# Altium integrated library GPDSE.IntLib: 634 symbols (part 3 of 7)
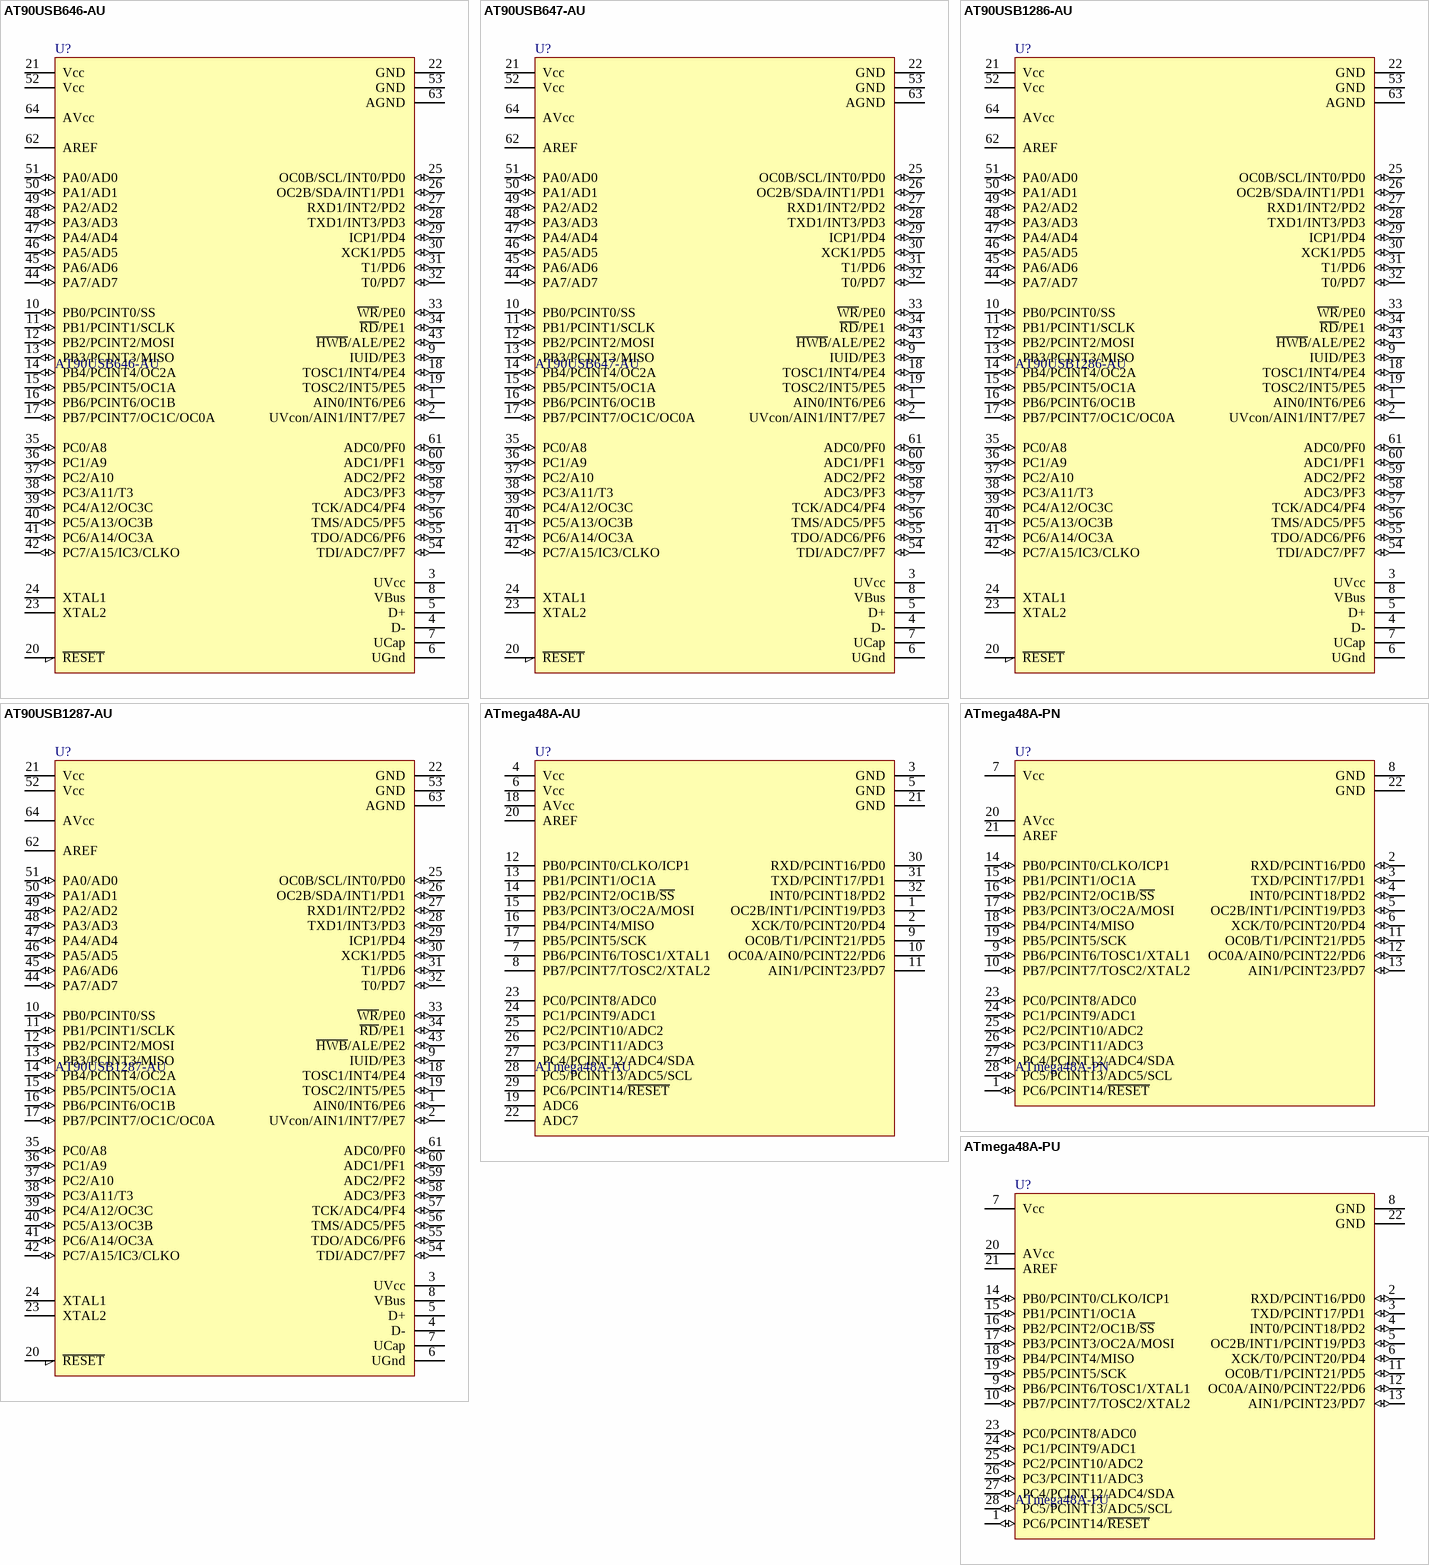
[diagram p37: symbols AT90USB646-AU to ATmega48A-PU]

## AT90USB1286-AU
designator U?
8-bit Microcontroller with 124 KB of ISP Flash and USB Controller; ADC Channel: 8; Analog Comparator: 1; Clock Frequency: 0 - 16 MHz; EEPROM Memory: 4 KB; Flash Memory: 128 KB; I/O Pins: 48; PWM Channel: 10; SRAM Memory: 8 KB; Supply Voltage (Vdd): 2.7 - 5.5 V; Timer 8 bits: 2; Debug: JTAG; USB Function: Device; Serial I2C: 1; Serial SPI: 1; Serial USART: 1; Timer 16 bits: 2; USB Controller: 1
footprint QFP64-14.0mm(0.8mm)
pins: 1 AIN0/INT6/PE6 (io), 2 UVcon/AIN1/INT7/PE7 (io), 3 UVcc, 4 D-, 5 D+, 6 UGnd, 7 UCap, 8 VBus, 9 IUID/PE3 (io), 10 PB0/PCINT0/SS (io), 11 PB1/PCINT1/SCLK (io), 12 PB2/PCINT2/MOSI (io), 13 PB3/PCINT3/MISO (io), 14 PB4/PCINT4/OC2A (io), 15 PB5/PCINT5/OC1A (io), 16 PB6/PCINT6/OC1B (io), 17 PB7/PCINT7/OC1C/OC0A (io), 18 TOSC1/INT4/PE4 (io), 19 TOSC2/INT5/PE5 (io), 20 ~{RESET}, 21 Vcc, 22 GND, 23 XTAL2, 24 XTAL1, 25 OC0B/SCL/INT0/PD0 (io), 26 OC2B/SDA/INT1/PD1 (io), 27 RXD1/INT2/PD2 (io), 28 TXD1/INT3/PD3 (io), 29 ICP1/PD4 (io), 30 XCK1/PD5 (io), 31 T1/PD6 (io), 32 T0/PD7 (io), 33 ~{WR}/PE0 (io), 34 ~{RD}/PE1 (io), 35 PC0/A8 (io), 36 PC1/A9 (io), 37 PC2/A10 (io), 38 PC3/A11/T3 (io), 39 PC4/A12/OC3C (io), 40 PC5/A13/OC3B (io), 41 PC6/A14/OC3A (io), 42 PC7/A15/IC3/CLKO (io), 43 ~{HWB}/ALE/PE2 (io), 44 PA7/AD7 (io), 45 PA6/AD6 (io), 46 PA5/AD5 (io), 47 PA4/AD4 (io), 48 PA3/AD3 (io), 49 PA2/AD2 (io), 50 PA1/AD1 (io), 51 PA0/AD0 (io), 52 Vcc, 53 GND, 54 TDI/ADC7/PF7 (io), 55 TDO/ADC6/PF6 (io), 56 TMS/ADC5/PF5 (io), 57 TCK/ADC4/PF4 (io), 58 ADC3/PF3 (io), 59 ADC2/PF2 (io), 60 ADC1/PF1 (io), 61 ADC0/PF0 (io), 62 AREF, 63 AGND, 64 AVcc

## AT90USB1287-AU
designator U?
8-bit Microcontroller with 128 KB of ISP Flash and USB Controller; ADC Channel: 8; Analog Comparator: 1; Clock Frequency: 0 - 16 MHz; EEPROM Memory: 4 KB; Flash Memory: 128 KB; I/O Pins: 48; PWM Channel: 10; SRAM Memory: 8 KB; Supply Voltage (Vdd): 2.7 - 5.5 V; Timer 8 bits: 2; Debug: JTAG; USB Function: OTG; Serial I2C: 1; Serial SPI: 1; Serial USART: 1; Timer 16 bits: 2; USB Controller: 1
footprint QFP64-14.0mm(0.8mm)
pins: 1 AIN0/INT6/PE6 (io), 2 UVcon/AIN1/INT7/PE7 (io), 3 UVcc, 4 D-, 5 D+, 6 UGnd, 7 UCap, 8 VBus, 9 IUID/PE3 (io), 10 PB0/PCINT0/SS (io), 11 PB1/PCINT1/SCLK (io), 12 PB2/PCINT2/MOSI (io), 13 PB3/PCINT3/MISO (io), 14 PB4/PCINT4/OC2A (io), 15 PB5/PCINT5/OC1A (io), 16 PB6/PCINT6/OC1B (io), 17 PB7/PCINT7/OC1C/OC0A (io), 18 TOSC1/INT4/PE4 (io), 19 TOSC2/INT5/PE5 (io), 20 ~{RESET}, 21 Vcc, 22 GND, 23 XTAL2, 24 XTAL1, 25 OC0B/SCL/INT0/PD0 (io), 26 OC2B/SDA/INT1/PD1 (io), 27 RXD1/INT2/PD2 (io), 28 TXD1/INT3/PD3 (io), 29 ICP1/PD4 (io), 30 XCK1/PD5 (io), 31 T1/PD6 (io), 32 T0/PD7 (io), 33 ~{WR}/PE0 (io), 34 ~{RD}/PE1 (io), 35 PC0/A8 (io), 36 PC1/A9 (io), 37 PC2/A10 (io), 38 PC3/A11/T3 (io), 39 PC4/A12/OC3C (io), 40 PC5/A13/OC3B (io), 41 PC6/A14/OC3A (io), 42 PC7/A15/IC3/CLKO (io), 43 ~{HWB}/ALE/PE2 (io), 44 PA7/AD7 (io), 45 PA6/AD6 (io), 46 PA5/AD5 (io), 47 PA4/AD4 (io), 48 PA3/AD3 (io), 49 PA2/AD2 (io), 50 PA1/AD1 (io), 51 PA0/AD0 (io), 52 Vcc, 53 GND, 54 TDI/ADC7/PF7 (io), 55 TDO/ADC6/PF6 (io), 56 TMS/ADC5/PF5 (io), 57 TCK/ADC4/PF4 (io), 58 ADC3/PF3 (io), 59 ADC2/PF2 (io), 60 ADC1/PF1 (io), 61 ADC0/PF0 (io), 62 AREF, 63 AGND, 64 AVcc

## ATmega48A-AU
designator U?
8-bit AVR Microcontroller with 4 KB In-System Programmable Flash; Flash Memory: 4 KB; EEPROM Memory: 256 B; SRAM Memory: 512 B; Timer 8 bits: 2; Timer 16 bits: 1; PWM Channel: 6; ADC Channel: 8; I/O Pins: 23; Supply Voltage (Vdd): 1.8 - 5.5 V; Clock Frequency: 0 - 20 MHz; Debug: debugWire; Serial USART: 1; Serial SPI: 1; Serial I2C: 1; Analog Comparator: 1
footprint QFP32-7.0mm(0.8mm)
pins: 1 OC2B/INT1/PCINT19/PD3, 2 XCK/T0/PCINT20/PD4, 3 GND, 4 Vcc, 5 GND, 6 Vcc, 7 PB6/PCINT6/TOSC1/XTAL1, 8 PB7/PCINT7/TOSC2/XTAL2, 9 OC0B/T1/PCINT21/PD5, 10 OC0A/AIN0/PCINT22/PD6, 11 AIN1/PCINT23/PD7, 12 PB0/PCINT0/CLKO/ICP1, 13 PB1/PCINT1/OC1A, 14 PB2/PCINT2/OC1B/~{SS}, 15 PB3/PCINT3/OC2A/MOSI, 16 PB4/PCINT4/MISO, 17 PB5/PCINT5/SCK, 18 AVcc, 19 ADC6, 20 AREF, 21 GND, 22 ADC7, 23 PC0/PCINT8/ADC0, 24 PC1/PCINT9/ADC1, 25 PC2/PCINT10/ADC2, 26 PC3/PCINT11/ADC3, 27 PC4/PCINT12/ADC4/SDA, 28 PC5/PCINT13/ADC5/SCL, 29 PC6/PCINT14/~{RESET}, 30 RXD/PCINT16/PD0, 31 TXD/PCINT17/PD1, 32 INT0/PCINT18/PD2

## ATmega48A-PN
designator U?
8-bit AVR Microcontroller with 4 KB In-System Programmable Flash; Flash Memory: 4 KB; EEPROM Memory: 256 B; SRAM Memory: 512 B; Timer 8 bits: 2; Timer 16 bits: 1; PWM Channel: 6; I/O Pins: 23; Supply Voltage (Vdd): 1.8 - 5.5 V; Clock Frequency: 0 - 20 MHz; Debug: debugWire; ADC Channel: 6; Serial USART: 1; Serial SPI: 1; Serial I2C: 1; Analog Comparator: 1
footprint DIP28-300(100) (DIP, 28-Leads, Row Spacing 7.62mm, Pitch 2.54mm, Body 34.67x7.3mm)
pins: 1 PC6/PCINT14/~{RESET} (io), 2 RXD/PCINT16/PD0 (io), 3 TXD/PCINT17/PD1 (io), 4 INT0/PCINT18/PD2 (io), 5 OC2B/INT1/PCINT19/PD3 (io), 6 XCK/T0/PCINT20/PD4 (io), 7 Vcc, 8 GND, 9 PB6/PCINT6/TOSC1/XTAL1 (io), 10 PB7/PCINT7/TOSC2/XTAL2 (io), 11 OC0B/T1/PCINT21/PD5 (io), 12 OC0A/AIN0/PCINT22/PD6 (io), 13 AIN1/PCINT23/PD7 (io), 14 PB0/PCINT0/CLKO/ICP1 (io), 15 PB1/PCINT1/OC1A (io), 16 PB2/PCINT2/OC1B/~{SS} (io), 17 PB3/PCINT3/OC2A/MOSI (io), 18 PB4/PCINT4/MISO (io), 19 PB5/PCINT5/SCK (io), 20 AVcc, 21 AREF, 22 GND, 23 PC0/PCINT8/ADC0 (io), 24 PC1/PCINT9/ADC1 (io), 25 PC2/PCINT10/ADC2 (io), 26 PC3/PCINT11/ADC3 (io), 27 PC4/PCINT12/ADC4/SDA (io), 28 PC5/PCINT13/ADC5/SCL (io)

## ATmega48A-PU
designator U?
8-bit AVR Microcontroller with 4 KB In-System Programmable Flash; Flash Memory: 4 KB; EEPROM Memory: 256 B; SRAM Memory: 512 B; Timer 8 bits: 2; Timer 16 bits: 1; PWM Channel: 6; I/O Pins: 23; Supply Voltage (Vdd): 1.8 - 5.5 V; Clock Frequency: 0 - 20 MHz; Debug: debugWire; ADC Channel: 6; Serial USART: 1; Serial SPI: 1; Serial I2C: 1; Analog Comparator: 1
footprint DIP28-300(100) (DIP, 28-Leads, Row Spacing 7.62mm, Pitch 2.54mm, Body 34.67x7.3mm)
pins: 1 PC6/PCINT14/~{RESET} (io), 2 RXD/PCINT16/PD0 (io), 3 TXD/PCINT17/PD1 (io), 4 INT0/PCINT18/PD2 (io), 5 OC2B/INT1/PCINT19/PD3 (io), 6 XCK/T0/PCINT20/PD4 (io), 7 Vcc, 8 GND, 9 PB6/PCINT6/TOSC1/XTAL1 (io), 10 PB7/PCINT7/TOSC2/XTAL2 (io), 11 OC0B/T1/PCINT21/PD5 (io), 12 OC0A/AIN0/PCINT22/PD6 (io), 13 AIN1/PCINT23/PD7 (io), 14 PB0/PCINT0/CLKO/ICP1 (io), 15 PB1/PCINT1/OC1A (io), 16 PB2/PCINT2/OC1B/~{SS} (io), 17 PB3/PCINT3/OC2A/MOSI (io), 18 PB4/PCINT4/MISO (io), 19 PB5/PCINT5/SCK (io), 20 AVcc, 21 AREF, 22 GND, 23 PC0/PCINT8/ADC0 (io), 24 PC1/PCINT9/ADC1 (io), 25 PC2/PCINT10/ADC2 (io), 26 PC3/PCINT11/ADC3 (io), 27 PC4/PCINT12/ADC4/SDA (io), 28 PC5/PCINT13/ADC5/SCL (io)

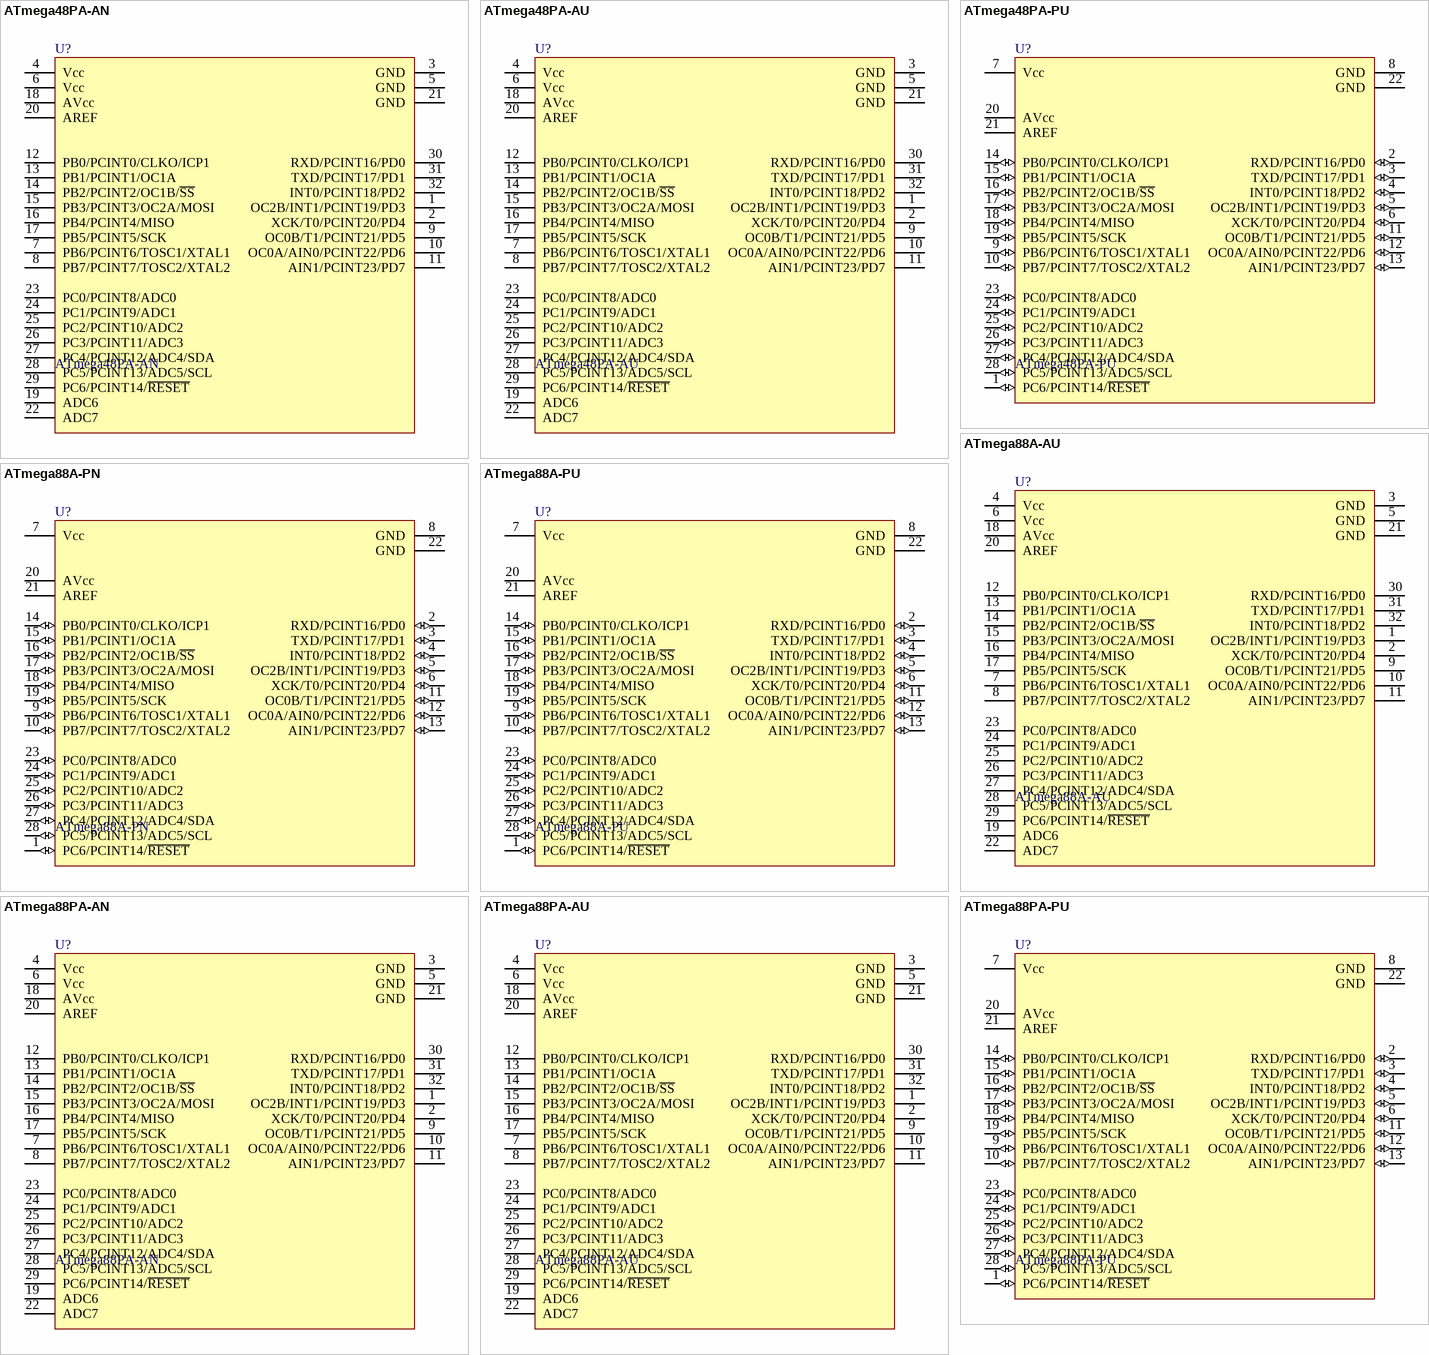
[diagram p13: symbols ATmega48PA-AN to ATmega88PA-PU]

## ATmega48PA-AN
designator U?
8-bit AVR Microcontroller with 4 KB In-System Programmable Flash; Flash Memory: 4 KB; EEPROM Memory: 256 B; SRAM Memory: 512 B; Timer 8 bits: 2; Timer 16 bits: 1; PWM Channel: 6; ADC Channel: 8; I/O Pins: 23; Supply Voltage (Vdd): 1.8 - 5.5 V; Clock Frequency: 0 - 20 MHz; Debug: debugWire; Serial USART: 1; Serial SPI: 1; Serial I2C: 1; Analog Comparator: 1
footprint QFP32-7.0mm(0.8mm)
pins: 1 OC2B/INT1/PCINT19/PD3, 2 XCK/T0/PCINT20/PD4, 3 GND, 4 Vcc, 5 GND, 6 Vcc, 7 PB6/PCINT6/TOSC1/XTAL1, 8 PB7/PCINT7/TOSC2/XTAL2, 9 OC0B/T1/PCINT21/PD5, 10 OC0A/AIN0/PCINT22/PD6, 11 AIN1/PCINT23/PD7, 12 PB0/PCINT0/CLKO/ICP1, 13 PB1/PCINT1/OC1A, 14 PB2/PCINT2/OC1B/~{SS}, 15 PB3/PCINT3/OC2A/MOSI, 16 PB4/PCINT4/MISO, 17 PB5/PCINT5/SCK, 18 AVcc, 19 ADC6, 20 AREF, 21 GND, 22 ADC7, 23 PC0/PCINT8/ADC0, 24 PC1/PCINT9/ADC1, 25 PC2/PCINT10/ADC2, 26 PC3/PCINT11/ADC3, 27 PC4/PCINT12/ADC4/SDA, 28 PC5/PCINT13/ADC5/SCL, 29 PC6/PCINT14/~{RESET}, 30 RXD/PCINT16/PD0, 31 TXD/PCINT17/PD1, 32 INT0/PCINT18/PD2

## ATmega48PA-AU
designator U?
8-bit AVR Microcontroller with 4 KB In-System Programmable Flash; Flash Memory: 4 KB; EEPROM Memory: 256 B; SRAM Memory: 512 B; Timer 8 bits: 2; Timer 16 bits: 1; PWM Channel: 6; ADC Channel: 8; I/O Pins: 23; Supply Voltage (Vdd): 1.8 - 5.5 V; Clock Frequency: 0 - 20 MHz; Debug: debugWire; Serial USART: 1; Serial SPI: 1; Serial I2C: 1; Analog Comparator: 1
footprint QFP32-7.0mm(0.8mm)
pins: 1 OC2B/INT1/PCINT19/PD3, 2 XCK/T0/PCINT20/PD4, 3 GND, 4 Vcc, 5 GND, 6 Vcc, 7 PB6/PCINT6/TOSC1/XTAL1, 8 PB7/PCINT7/TOSC2/XTAL2, 9 OC0B/T1/PCINT21/PD5, 10 OC0A/AIN0/PCINT22/PD6, 11 AIN1/PCINT23/PD7, 12 PB0/PCINT0/CLKO/ICP1, 13 PB1/PCINT1/OC1A, 14 PB2/PCINT2/OC1B/~{SS}, 15 PB3/PCINT3/OC2A/MOSI, 16 PB4/PCINT4/MISO, 17 PB5/PCINT5/SCK, 18 AVcc, 19 ADC6, 20 AREF, 21 GND, 22 ADC7, 23 PC0/PCINT8/ADC0, 24 PC1/PCINT9/ADC1, 25 PC2/PCINT10/ADC2, 26 PC3/PCINT11/ADC3, 27 PC4/PCINT12/ADC4/SDA, 28 PC5/PCINT13/ADC5/SCL, 29 PC6/PCINT14/~{RESET}, 30 RXD/PCINT16/PD0, 31 TXD/PCINT17/PD1, 32 INT0/PCINT18/PD2

## ATmega48PA-PU
designator U?
8-bit AVR Microcontroller with 4 KB In-System Programmable Flash; Flash Memory: 4 KB; EEPROM Memory: 256 B; SRAM Memory: 512 B; Timer 8 bits: 2; Timer 16 bits: 1; PWM Channel: 6; I/O Pins: 23; Supply Voltage (Vdd): 1.8 - 5.5 V; Clock Frequency: 0 - 20 MHz; Debug: debugWire; ADC Channel: 6; Serial USART: 1; Serial SPI: 1; Serial I2C: 1; Analog Comparator: 1
footprint DIP28-300(100) (DIP, 28-Leads, Row Spacing 7.62mm, Pitch 2.54mm, Body 34.67x7.3mm)
pins: 1 PC6/PCINT14/~{RESET} (io), 2 RXD/PCINT16/PD0 (io), 3 TXD/PCINT17/PD1 (io), 4 INT0/PCINT18/PD2 (io), 5 OC2B/INT1/PCINT19/PD3 (io), 6 XCK/T0/PCINT20/PD4 (io), 7 Vcc, 8 GND, 9 PB6/PCINT6/TOSC1/XTAL1 (io), 10 PB7/PCINT7/TOSC2/XTAL2 (io), 11 OC0B/T1/PCINT21/PD5 (io), 12 OC0A/AIN0/PCINT22/PD6 (io), 13 AIN1/PCINT23/PD7 (io), 14 PB0/PCINT0/CLKO/ICP1 (io), 15 PB1/PCINT1/OC1A (io), 16 PB2/PCINT2/OC1B/~{SS} (io), 17 PB3/PCINT3/OC2A/MOSI (io), 18 PB4/PCINT4/MISO (io), 19 PB5/PCINT5/SCK (io), 20 AVcc, 21 AREF, 22 GND, 23 PC0/PCINT8/ADC0 (io), 24 PC1/PCINT9/ADC1 (io), 25 PC2/PCINT10/ADC2 (io), 26 PC3/PCINT11/ADC3 (io), 27 PC4/PCINT12/ADC4/SDA (io), 28 PC5/PCINT13/ADC5/SCL (io)

## ATmega88A-AU
designator U?
8-bit AVR Microcontroller with 8 KB In-System Programmable Flash; Flash Memory: 8 KB; EEPROM Memory: 512 B; SRAM Memory: 1 KB; Timer 8 bits: 2; Timer 16 bits: 1; PWM Channel: 6; ADC Channel: 8; I/O Pins: 23; Supply Voltage (Vdd): 1.8 - 5.5 V; Clock Frequency: 0 - 20 MHz; Debug: debugWire; Serial USART: 1; Serial SPI: 1; Serial I2C: 1; Analog Comparator: 1
footprint QFP32-7.0mm(0.8mm)
pins: 1 OC2B/INT1/PCINT19/PD3, 2 XCK/T0/PCINT20/PD4, 3 GND, 4 Vcc, 5 GND, 6 Vcc, 7 PB6/PCINT6/TOSC1/XTAL1, 8 PB7/PCINT7/TOSC2/XTAL2, 9 OC0B/T1/PCINT21/PD5, 10 OC0A/AIN0/PCINT22/PD6, 11 AIN1/PCINT23/PD7, 12 PB0/PCINT0/CLKO/ICP1, 13 PB1/PCINT1/OC1A, 14 PB2/PCINT2/OC1B/~{SS}, 15 PB3/PCINT3/OC2A/MOSI, 16 PB4/PCINT4/MISO, 17 PB5/PCINT5/SCK, 18 AVcc, 19 ADC6, 20 AREF, 21 GND, 22 ADC7, 23 PC0/PCINT8/ADC0, 24 PC1/PCINT9/ADC1, 25 PC2/PCINT10/ADC2, 26 PC3/PCINT11/ADC3, 27 PC4/PCINT12/ADC4/SDA, 28 PC5/PCINT13/ADC5/SCL, 29 PC6/PCINT14/~{RESET}, 30 RXD/PCINT16/PD0, 31 TXD/PCINT17/PD1, 32 INT0/PCINT18/PD2

## ATmega88A-PN
designator U?
8-bit AVR Microcontroller with 8 KB In-System Programmable Flash; Flash Memory: 8 KB; EEPROM Memory: 512 B; SRAM Memory: 1 KB; Timer 8 bits: 2; Timer 16 bits: 1; PWM Channel: 6; I/O Pins: 23; Supply Voltage (Vdd): 1.8 - 5.5 V; Clock Frequency: 0 - 20 MHz; Debug: debugWire; ADC Channel: 6; Serial USART: 1; Serial SPI: 1; Serial I2C: 1; Analog Comparator: 1
footprint DIP28-300(100) (DIP, 28-Leads, Row Spacing 7.62mm, Pitch 2.54mm, Body 34.67x7.3mm)
pins: 1 PC6/PCINT14/~{RESET} (io), 2 RXD/PCINT16/PD0 (io), 3 TXD/PCINT17/PD1 (io), 4 INT0/PCINT18/PD2 (io), 5 OC2B/INT1/PCINT19/PD3 (io), 6 XCK/T0/PCINT20/PD4 (io), 7 Vcc, 8 GND, 9 PB6/PCINT6/TOSC1/XTAL1 (io), 10 PB7/PCINT7/TOSC2/XTAL2 (io), 11 OC0B/T1/PCINT21/PD5 (io), 12 OC0A/AIN0/PCINT22/PD6 (io), 13 AIN1/PCINT23/PD7 (io), 14 PB0/PCINT0/CLKO/ICP1 (io), 15 PB1/PCINT1/OC1A (io), 16 PB2/PCINT2/OC1B/~{SS} (io), 17 PB3/PCINT3/OC2A/MOSI (io), 18 PB4/PCINT4/MISO (io), 19 PB5/PCINT5/SCK (io), 20 AVcc, 21 AREF, 22 GND, 23 PC0/PCINT8/ADC0 (io), 24 PC1/PCINT9/ADC1 (io), 25 PC2/PCINT10/ADC2 (io), 26 PC3/PCINT11/ADC3 (io), 27 PC4/PCINT12/ADC4/SDA (io), 28 PC5/PCINT13/ADC5/SCL (io)

## ATmega88A-PU
designator U?
8-bit AVR Microcontroller with 8 KB In-System Programmable Flash; Flash Memory: 8 KB; EEPROM Memory: 512 B; SRAM Memory: 1 KB; Timer 8 bits: 2; Timer 16 bits: 1; PWM Channel: 6; I/O Pins: 23; Supply Voltage (Vdd): 1.8 - 5.5 V; Clock Frequency: 0 - 20 MHz; Debug: debugWire; ADC Channel: 6; Serial USART: 1; Serial SPI: 1; Serial I2C: 1; Analog Comparator: 1
footprint DIP28-300(100) (DIP, 28-Leads, Row Spacing 7.62mm, Pitch 2.54mm, Body 34.67x7.3mm)
pins: 1 PC6/PCINT14/~{RESET} (io), 2 RXD/PCINT16/PD0 (io), 3 TXD/PCINT17/PD1 (io), 4 INT0/PCINT18/PD2 (io), 5 OC2B/INT1/PCINT19/PD3 (io), 6 XCK/T0/PCINT20/PD4 (io), 7 Vcc, 8 GND, 9 PB6/PCINT6/TOSC1/XTAL1 (io), 10 PB7/PCINT7/TOSC2/XTAL2 (io), 11 OC0B/T1/PCINT21/PD5 (io), 12 OC0A/AIN0/PCINT22/PD6 (io), 13 AIN1/PCINT23/PD7 (io), 14 PB0/PCINT0/CLKO/ICP1 (io), 15 PB1/PCINT1/OC1A (io), 16 PB2/PCINT2/OC1B/~{SS} (io), 17 PB3/PCINT3/OC2A/MOSI (io), 18 PB4/PCINT4/MISO (io), 19 PB5/PCINT5/SCK (io), 20 AVcc, 21 AREF, 22 GND, 23 PC0/PCINT8/ADC0 (io), 24 PC1/PCINT9/ADC1 (io), 25 PC2/PCINT10/ADC2 (io), 26 PC3/PCINT11/ADC3 (io), 27 PC4/PCINT12/ADC4/SDA (io), 28 PC5/PCINT13/ADC5/SCL (io)

## ATmega88PA-AN
designator U?
8-bit AVR Microcontroller with 8 KB In-System Programmable Flash; Flash Memory: 8 KB; EEPROM Memory: 512 B; SRAM Memory: 1 KB; Timer 8 bits: 2; Timer 16 bits: 1; PWM Channel: 6; ADC Channel: 8; I/O Pins: 23; Supply Voltage (Vdd): 1.8 - 5.5 V; Clock Frequency: 0 - 20 MHz; Debug: debugWire; Serial USART: 1; Serial SPI: 1; Serial I2C: 1; Analog Comparator: 1
footprint QFP32-7.0mm(0.8mm)
pins: 1 OC2B/INT1/PCINT19/PD3, 2 XCK/T0/PCINT20/PD4, 3 GND, 4 Vcc, 5 GND, 6 Vcc, 7 PB6/PCINT6/TOSC1/XTAL1, 8 PB7/PCINT7/TOSC2/XTAL2, 9 OC0B/T1/PCINT21/PD5, 10 OC0A/AIN0/PCINT22/PD6, 11 AIN1/PCINT23/PD7, 12 PB0/PCINT0/CLKO/ICP1, 13 PB1/PCINT1/OC1A, 14 PB2/PCINT2/OC1B/~{SS}, 15 PB3/PCINT3/OC2A/MOSI, 16 PB4/PCINT4/MISO, 17 PB5/PCINT5/SCK, 18 AVcc, 19 ADC6, 20 AREF, 21 GND, 22 ADC7, 23 PC0/PCINT8/ADC0, 24 PC1/PCINT9/ADC1, 25 PC2/PCINT10/ADC2, 26 PC3/PCINT11/ADC3, 27 PC4/PCINT12/ADC4/SDA, 28 PC5/PCINT13/ADC5/SCL, 29 PC6/PCINT14/~{RESET}, 30 RXD/PCINT16/PD0, 31 TXD/PCINT17/PD1, 32 INT0/PCINT18/PD2

## ATmega88PA-AU
designator U?
8-bit AVR Microcontroller with 8 KB In-System Programmable Flash; Flash Memory: 8 KB; EEPROM Memory: 512 B; SRAM Memory: 1 KB; Timer 8 bits: 2; Timer 16 bits: 1; PWM Channel: 6; ADC Channel: 8; I/O Pins: 23; Supply Voltage (Vdd): 1.8 - 5.5 V; Clock Frequency: 0 - 20 MHz; Debug: debugWire; Serial USART: 1; Serial SPI: 1; Serial I2C: 1; Analog Comparator: 1
footprint QFP32-7.0mm(0.8mm)
pins: 1 OC2B/INT1/PCINT19/PD3, 2 XCK/T0/PCINT20/PD4, 3 GND, 4 Vcc, 5 GND, 6 Vcc, 7 PB6/PCINT6/TOSC1/XTAL1, 8 PB7/PCINT7/TOSC2/XTAL2, 9 OC0B/T1/PCINT21/PD5, 10 OC0A/AIN0/PCINT22/PD6, 11 AIN1/PCINT23/PD7, 12 PB0/PCINT0/CLKO/ICP1, 13 PB1/PCINT1/OC1A, 14 PB2/PCINT2/OC1B/~{SS}, 15 PB3/PCINT3/OC2A/MOSI, 16 PB4/PCINT4/MISO, 17 PB5/PCINT5/SCK, 18 AVcc, 19 ADC6, 20 AREF, 21 GND, 22 ADC7, 23 PC0/PCINT8/ADC0, 24 PC1/PCINT9/ADC1, 25 PC2/PCINT10/ADC2, 26 PC3/PCINT11/ADC3, 27 PC4/PCINT12/ADC4/SDA, 28 PC5/PCINT13/ADC5/SCL, 29 PC6/PCINT14/~{RESET}, 30 RXD/PCINT16/PD0, 31 TXD/PCINT17/PD1, 32 INT0/PCINT18/PD2

## ATmega88PA-PU
designator U?
8-bit AVR Microcontroller with 8 KB In-System Programmable Flash; Flash Memory: 8 KB; EEPROM Memory: 512 B; SRAM Memory: 1 KB; Timer 8 bits: 2; Timer 16 bits: 1; PWM Channel: 6; I/O Pins: 23; Supply Voltage (Vdd): 1.8 - 5.5 V; Clock Frequency: 0 - 20 MHz; Debug: debugWire; ADC Channel: 6; Serial USART: 1; Serial SPI: 1; Serial I2C: 1; Analog Comparator: 1
footprint DIP28-300(100) (DIP, 28-Leads, Row Spacing 7.62mm, Pitch 2.54mm, Body 34.67x7.3mm)
pins: 1 PC6/PCINT14/~{RESET} (io), 2 RXD/PCINT16/PD0 (io), 3 TXD/PCINT17/PD1 (io), 4 INT0/PCINT18/PD2 (io), 5 OC2B/INT1/PCINT19/PD3 (io), 6 XCK/T0/PCINT20/PD4 (io), 7 Vcc, 8 GND, 9 PB6/PCINT6/TOSC1/XTAL1 (io), 10 PB7/PCINT7/TOSC2/XTAL2 (io), 11 OC0B/T1/PCINT21/PD5 (io), 12 OC0A/AIN0/PCINT22/PD6 (io), 13 AIN1/PCINT23/PD7 (io), 14 PB0/PCINT0/CLKO/ICP1 (io), 15 PB1/PCINT1/OC1A (io), 16 PB2/PCINT2/OC1B/~{SS} (io), 17 PB3/PCINT3/OC2A/MOSI (io), 18 PB4/PCINT4/MISO (io), 19 PB5/PCINT5/SCK (io), 20 AVcc, 21 AREF, 22 GND, 23 PC0/PCINT8/ADC0 (io), 24 PC1/PCINT9/ADC1 (io), 25 PC2/PCINT10/ADC2 (io), 26 PC3/PCINT11/ADC3 (io), 27 PC4/PCINT12/ADC4/SDA (io), 28 PC5/PCINT13/ADC5/SCL (io)

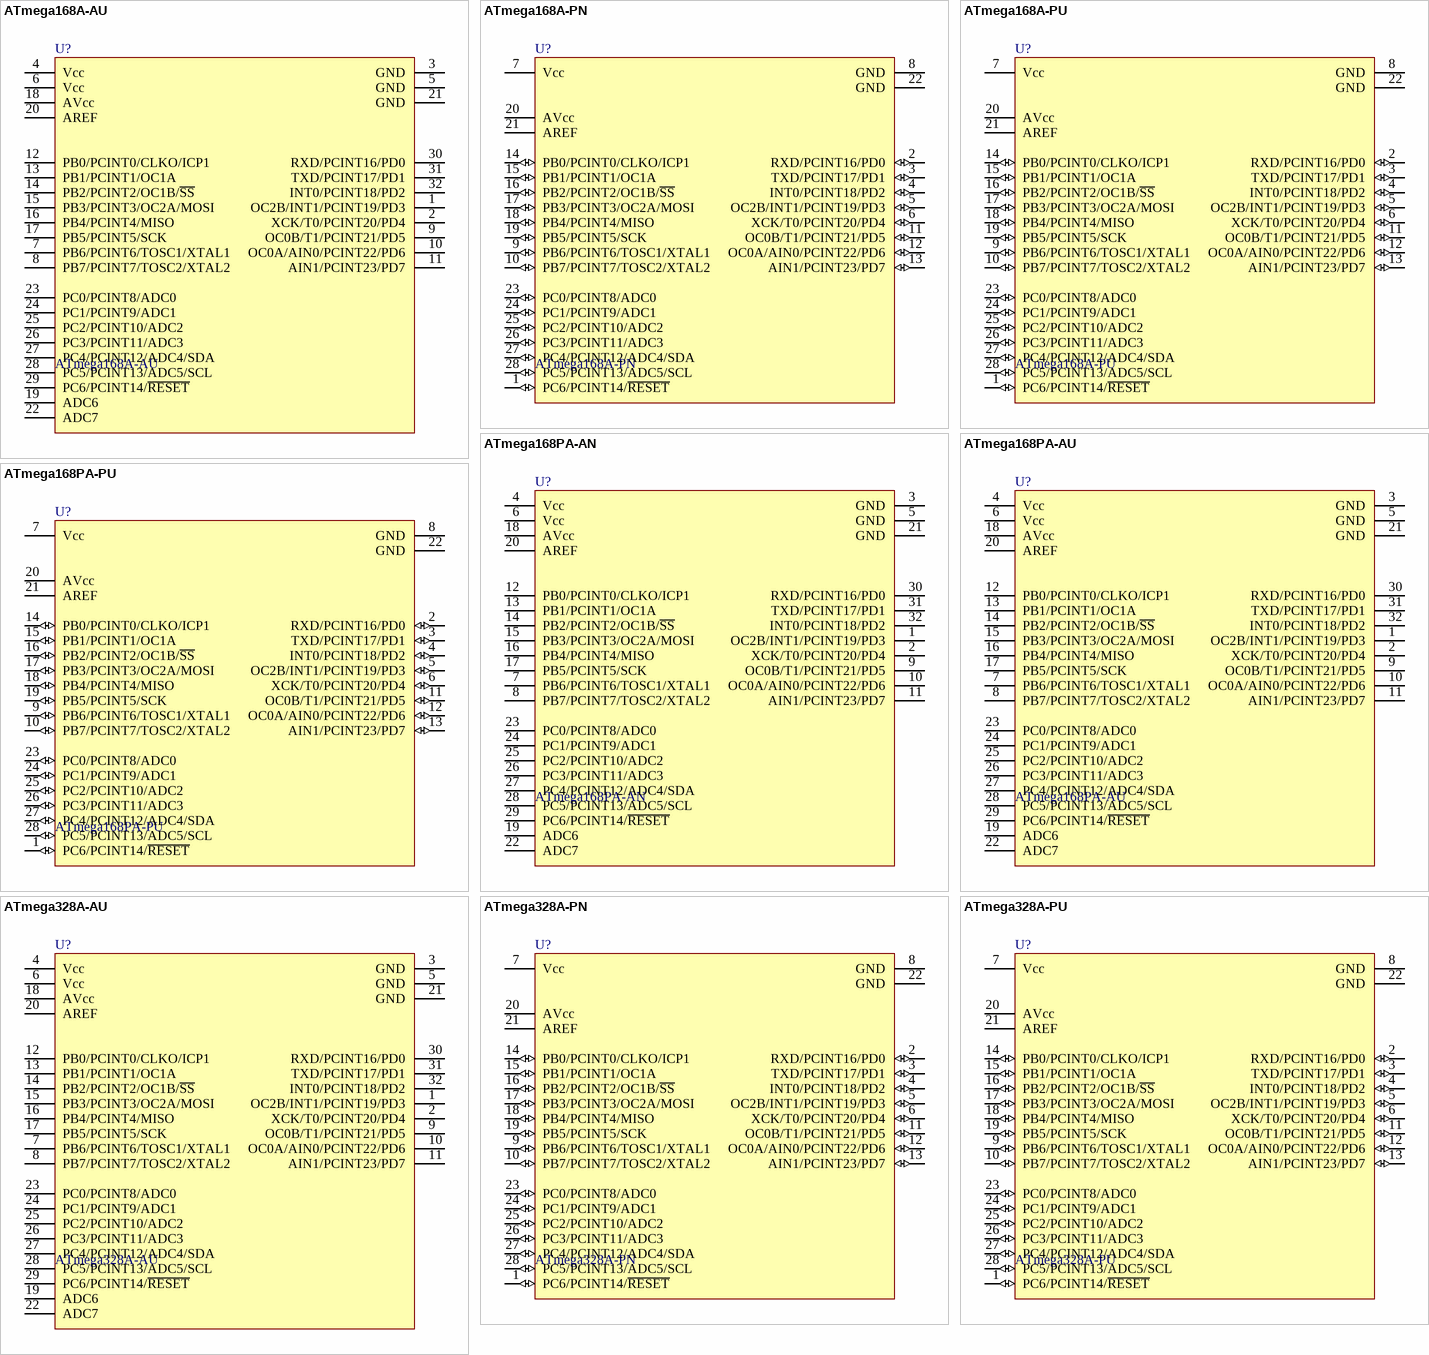
[diagram p14: symbols ATmega168A-AU to ATmega328A-PU]

## ATmega168A-AU
designator U?
8-bit AVR Microcontroller with 16 KB In-System Programmable Flash; Flash Memory: 16 KB; EEPROM Memory: 512 B; SRAM Memory: 1 KB; Timer 8 bits: 2; Timer 16 bits: 1; PWM Channel: 6; ADC Channel: 8; I/O Pins: 23; Supply Voltage (Vdd): 1.8 - 5.5 V; Clock Frequency: 0 - 20 MHz; Debug: debugWire; Serial USART: 1; Serial SPI: 1; Serial I2C: 1; Analog Comparator: 1
footprint QFP32-7.0mm(0.8mm)
pins: 1 OC2B/INT1/PCINT19/PD3, 2 XCK/T0/PCINT20/PD4, 3 GND, 4 Vcc, 5 GND, 6 Vcc, 7 PB6/PCINT6/TOSC1/XTAL1, 8 PB7/PCINT7/TOSC2/XTAL2, 9 OC0B/T1/PCINT21/PD5, 10 OC0A/AIN0/PCINT22/PD6, 11 AIN1/PCINT23/PD7, 12 PB0/PCINT0/CLKO/ICP1, 13 PB1/PCINT1/OC1A, 14 PB2/PCINT2/OC1B/~{SS}, 15 PB3/PCINT3/OC2A/MOSI, 16 PB4/PCINT4/MISO, 17 PB5/PCINT5/SCK, 18 AVcc, 19 ADC6, 20 AREF, 21 GND, 22 ADC7, 23 PC0/PCINT8/ADC0, 24 PC1/PCINT9/ADC1, 25 PC2/PCINT10/ADC2, 26 PC3/PCINT11/ADC3, 27 PC4/PCINT12/ADC4/SDA, 28 PC5/PCINT13/ADC5/SCL, 29 PC6/PCINT14/~{RESET}, 30 RXD/PCINT16/PD0, 31 TXD/PCINT17/PD1, 32 INT0/PCINT18/PD2

## ATmega168A-PN
designator U?
8-bit AVR Microcontroller with 16 KB In-System Programmable Flash; Flash Memory: 16 KB; EEPROM Memory: 512 B; SRAM Memory: 1 KB; Timer 8 bits: 2; Timer 16 bits: 1; PWM Channel: 6; I/O Pins: 23; Supply Voltage (Vdd): 1.8 - 5.5 V; Clock Frequency: 0 - 20 MHz; Debug: debugWire; ADC Channel: 6; Serial USART: 1; Serial SPI: 1; Serial I2C: 1; Analog Comparator: 1
footprint DIP28-300(100) (DIP, 28-Leads, Row Spacing 7.62mm, Pitch 2.54mm, Body 34.67x7.3mm)
pins: 1 PC6/PCINT14/~{RESET} (io), 2 RXD/PCINT16/PD0 (io), 3 TXD/PCINT17/PD1 (io), 4 INT0/PCINT18/PD2 (io), 5 OC2B/INT1/PCINT19/PD3 (io), 6 XCK/T0/PCINT20/PD4 (io), 7 Vcc, 8 GND, 9 PB6/PCINT6/TOSC1/XTAL1 (io), 10 PB7/PCINT7/TOSC2/XTAL2 (io), 11 OC0B/T1/PCINT21/PD5 (io), 12 OC0A/AIN0/PCINT22/PD6 (io), 13 AIN1/PCINT23/PD7 (io), 14 PB0/PCINT0/CLKO/ICP1 (io), 15 PB1/PCINT1/OC1A (io), 16 PB2/PCINT2/OC1B/~{SS} (io), 17 PB3/PCINT3/OC2A/MOSI (io), 18 PB4/PCINT4/MISO (io), 19 PB5/PCINT5/SCK (io), 20 AVcc, 21 AREF, 22 GND, 23 PC0/PCINT8/ADC0 (io), 24 PC1/PCINT9/ADC1 (io), 25 PC2/PCINT10/ADC2 (io), 26 PC3/PCINT11/ADC3 (io), 27 PC4/PCINT12/ADC4/SDA (io), 28 PC5/PCINT13/ADC5/SCL (io)

## ATmega168A-PU
designator U?
8-bit AVR Microcontroller with 16 KB In-System Programmable Flash; Flash Memory: 16 KB; EEPROM Memory: 512 B; SRAM Memory: 1 KB; Timer 8 bits: 2; Timer 16 bits: 1; PWM Channel: 6; I/O Pins: 23; Supply Voltage (Vdd): 1.8 - 5.5 V; Clock Frequency: 0 - 20 MHz; Debug: debugWire; ADC Channel: 6; Serial USART: 1; Serial SPI: 1; Serial I2C: 1; Analog Comparator: 1
footprint DIP28-300(100) (DIP, 28-Leads, Row Spacing 7.62mm, Pitch 2.54mm, Body 34.67x7.3mm)
pins: 1 PC6/PCINT14/~{RESET} (io), 2 RXD/PCINT16/PD0 (io), 3 TXD/PCINT17/PD1 (io), 4 INT0/PCINT18/PD2 (io), 5 OC2B/INT1/PCINT19/PD3 (io), 6 XCK/T0/PCINT20/PD4 (io), 7 Vcc, 8 GND, 9 PB6/PCINT6/TOSC1/XTAL1 (io), 10 PB7/PCINT7/TOSC2/XTAL2 (io), 11 OC0B/T1/PCINT21/PD5 (io), 12 OC0A/AIN0/PCINT22/PD6 (io), 13 AIN1/PCINT23/PD7 (io), 14 PB0/PCINT0/CLKO/ICP1 (io), 15 PB1/PCINT1/OC1A (io), 16 PB2/PCINT2/OC1B/~{SS} (io), 17 PB3/PCINT3/OC2A/MOSI (io), 18 PB4/PCINT4/MISO (io), 19 PB5/PCINT5/SCK (io), 20 AVcc, 21 AREF, 22 GND, 23 PC0/PCINT8/ADC0 (io), 24 PC1/PCINT9/ADC1 (io), 25 PC2/PCINT10/ADC2 (io), 26 PC3/PCINT11/ADC3 (io), 27 PC4/PCINT12/ADC4/SDA (io), 28 PC5/PCINT13/ADC5/SCL (io)

## ATmega168PA-AN
designator U?
8-bit AVR Microcontroller with 16 KB In-System Programmable Flash; Flash Memory: 16 KB; EEPROM Memory: 512 B; SRAM Memory: 1 KB; Timer 8 bits: 2; Timer 16 bits: 1; PWM Channel: 6; ADC Channel: 8; I/O Pins: 23; Supply Voltage (Vdd): 1.8 - 5.5 V; Clock Frequency: 0 - 20 MHz; Debug: debugWire; Serial USART: 1; Serial SPI: 1; Serial I2C: 1; Analog Comparator: 1
footprint QFP32-7.0mm(0.8mm)
pins: 1 OC2B/INT1/PCINT19/PD3, 2 XCK/T0/PCINT20/PD4, 3 GND, 4 Vcc, 5 GND, 6 Vcc, 7 PB6/PCINT6/TOSC1/XTAL1, 8 PB7/PCINT7/TOSC2/XTAL2, 9 OC0B/T1/PCINT21/PD5, 10 OC0A/AIN0/PCINT22/PD6, 11 AIN1/PCINT23/PD7, 12 PB0/PCINT0/CLKO/ICP1, 13 PB1/PCINT1/OC1A, 14 PB2/PCINT2/OC1B/~{SS}, 15 PB3/PCINT3/OC2A/MOSI, 16 PB4/PCINT4/MISO, 17 PB5/PCINT5/SCK, 18 AVcc, 19 ADC6, 20 AREF, 21 GND, 22 ADC7, 23 PC0/PCINT8/ADC0, 24 PC1/PCINT9/ADC1, 25 PC2/PCINT10/ADC2, 26 PC3/PCINT11/ADC3, 27 PC4/PCINT12/ADC4/SDA, 28 PC5/PCINT13/ADC5/SCL, 29 PC6/PCINT14/~{RESET}, 30 RXD/PCINT16/PD0, 31 TXD/PCINT17/PD1, 32 INT0/PCINT18/PD2

## ATmega168PA-AU
designator U?
8-bit AVR Microcontroller with 16 KB In-System Programmable Flash; Flash Memory: 16 KB; EEPROM Memory: 512 B; SRAM Memory: 1 KB; Timer 8 bits: 2; Timer 16 bits: 1; PWM Channel: 6; ADC Channel: 8; I/O Pins: 23; Supply Voltage (Vdd): 1.8 - 5.5 V; Clock Frequency: 0 - 20 MHz; Debug: debugWire; Serial USART: 1; Serial SPI: 1; Serial I2C: 1; Analog Comparator: 1
footprint QFP32-7.0mm(0.8mm)
pins: 1 OC2B/INT1/PCINT19/PD3, 2 XCK/T0/PCINT20/PD4, 3 GND, 4 Vcc, 5 GND, 6 Vcc, 7 PB6/PCINT6/TOSC1/XTAL1, 8 PB7/PCINT7/TOSC2/XTAL2, 9 OC0B/T1/PCINT21/PD5, 10 OC0A/AIN0/PCINT22/PD6, 11 AIN1/PCINT23/PD7, 12 PB0/PCINT0/CLKO/ICP1, 13 PB1/PCINT1/OC1A, 14 PB2/PCINT2/OC1B/~{SS}, 15 PB3/PCINT3/OC2A/MOSI, 16 PB4/PCINT4/MISO, 17 PB5/PCINT5/SCK, 18 AVcc, 19 ADC6, 20 AREF, 21 GND, 22 ADC7, 23 PC0/PCINT8/ADC0, 24 PC1/PCINT9/ADC1, 25 PC2/PCINT10/ADC2, 26 PC3/PCINT11/ADC3, 27 PC4/PCINT12/ADC4/SDA, 28 PC5/PCINT13/ADC5/SCL, 29 PC6/PCINT14/~{RESET}, 30 RXD/PCINT16/PD0, 31 TXD/PCINT17/PD1, 32 INT0/PCINT18/PD2

## ATmega168PA-PU
designator U?
8-bit AVR Microcontroller with 16 KB In-System Programmable Flash; Flash Memory: 16 KB; EEPROM Memory: 512 B; SRAM Memory: 1 KB; Timer 8 bits: 2; Timer 16 bits: 1; PWM Channel: 6; I/O Pins: 23; Supply Voltage (Vdd): 1.8 - 5.5 V; Clock Frequency: 0 - 20 MHz; Debug: debugWire; ADC Channel: 6; Serial USART: 1; Serial SPI: 1; Serial I2C: 1; Analog Comparator: 1
footprint DIP28-300(100) (DIP, 28-Leads, Row Spacing 7.62mm, Pitch 2.54mm, Body 34.67x7.3mm)
pins: 1 PC6/PCINT14/~{RESET} (io), 2 RXD/PCINT16/PD0 (io), 3 TXD/PCINT17/PD1 (io), 4 INT0/PCINT18/PD2 (io), 5 OC2B/INT1/PCINT19/PD3 (io), 6 XCK/T0/PCINT20/PD4 (io), 7 Vcc, 8 GND, 9 PB6/PCINT6/TOSC1/XTAL1 (io), 10 PB7/PCINT7/TOSC2/XTAL2 (io), 11 OC0B/T1/PCINT21/PD5 (io), 12 OC0A/AIN0/PCINT22/PD6 (io), 13 AIN1/PCINT23/PD7 (io), 14 PB0/PCINT0/CLKO/ICP1 (io), 15 PB1/PCINT1/OC1A (io), 16 PB2/PCINT2/OC1B/~{SS} (io), 17 PB3/PCINT3/OC2A/MOSI (io), 18 PB4/PCINT4/MISO (io), 19 PB5/PCINT5/SCK (io), 20 AVcc, 21 AREF, 22 GND, 23 PC0/PCINT8/ADC0 (io), 24 PC1/PCINT9/ADC1 (io), 25 PC2/PCINT10/ADC2 (io), 26 PC3/PCINT11/ADC3 (io), 27 PC4/PCINT12/ADC4/SDA (io), 28 PC5/PCINT13/ADC5/SCL (io)

## ATmega328A-AU
designator U?
8-bit AVR Microcontroller with 32 KB In-System Programmable Flash; Flash Memory: 32 KB; EEPROM Memory: 1 KB; SRAM Memory: 2 KB; Timer 8 bits: 2; Timer 16 bits: 1; PWM Channel: 6; ADC Channel: 8; I/O Pins: 23; Supply Voltage (Vdd): 1.8 - 5.5 V; Clock Frequency: 0 - 20 MHz; Debug: debugWire; Serial USART: 1; Serial SPI: 1; Serial I2C: 1; Analog Comparator: 1
footprint QFP32-7.0mm(0.8mm)
pins: 1 OC2B/INT1/PCINT19/PD3, 2 XCK/T0/PCINT20/PD4, 3 GND, 4 Vcc, 5 GND, 6 Vcc, 7 PB6/PCINT6/TOSC1/XTAL1, 8 PB7/PCINT7/TOSC2/XTAL2, 9 OC0B/T1/PCINT21/PD5, 10 OC0A/AIN0/PCINT22/PD6, 11 AIN1/PCINT23/PD7, 12 PB0/PCINT0/CLKO/ICP1, 13 PB1/PCINT1/OC1A, 14 PB2/PCINT2/OC1B/~{SS}, 15 PB3/PCINT3/OC2A/MOSI, 16 PB4/PCINT4/MISO, 17 PB5/PCINT5/SCK, 18 AVcc, 19 ADC6, 20 AREF, 21 GND, 22 ADC7, 23 PC0/PCINT8/ADC0, 24 PC1/PCINT9/ADC1, 25 PC2/PCINT10/ADC2, 26 PC3/PCINT11/ADC3, 27 PC4/PCINT12/ADC4/SDA, 28 PC5/PCINT13/ADC5/SCL, 29 PC6/PCINT14/~{RESET}, 30 RXD/PCINT16/PD0, 31 TXD/PCINT17/PD1, 32 INT0/PCINT18/PD2

## ATmega328A-PN
designator U?
8-bit AVR Microcontroller with 32 KB In-System Programmable Flash; Flash Memory: 32 KB; EEPROM Memory: 1 KB; SRAM Memory: 2 KB; Timer 8 bits: 2; Timer 16 bits: 1; PWM Channel: 6; I/O Pins: 23; Supply Voltage (Vdd): 1.8 - 5.5 V; Clock Frequency: 0 - 20 MHz; Debug: debugWire; ADC Channel: 6; Serial USART: 1; Serial SPI: 1; Serial I2C: 1; Analog Comparator: 1
footprint DIP28-300(100) (DIP, 28-Leads, Row Spacing 7.62mm, Pitch 2.54mm, Body 34.67x7.3mm)
pins: 1 PC6/PCINT14/~{RESET} (io), 2 RXD/PCINT16/PD0 (io), 3 TXD/PCINT17/PD1 (io), 4 INT0/PCINT18/PD2 (io), 5 OC2B/INT1/PCINT19/PD3 (io), 6 XCK/T0/PCINT20/PD4 (io), 7 Vcc, 8 GND, 9 PB6/PCINT6/TOSC1/XTAL1 (io), 10 PB7/PCINT7/TOSC2/XTAL2 (io), 11 OC0B/T1/PCINT21/PD5 (io), 12 OC0A/AIN0/PCINT22/PD6 (io), 13 AIN1/PCINT23/PD7 (io), 14 PB0/PCINT0/CLKO/ICP1 (io), 15 PB1/PCINT1/OC1A (io), 16 PB2/PCINT2/OC1B/~{SS} (io), 17 PB3/PCINT3/OC2A/MOSI (io), 18 PB4/PCINT4/MISO (io), 19 PB5/PCINT5/SCK (io), 20 AVcc, 21 AREF, 22 GND, 23 PC0/PCINT8/ADC0 (io), 24 PC1/PCINT9/ADC1 (io), 25 PC2/PCINT10/ADC2 (io), 26 PC3/PCINT11/ADC3 (io), 27 PC4/PCINT12/ADC4/SDA (io), 28 PC5/PCINT13/ADC5/SCL (io)

## ATmega328A-PU
designator U?
8-bit AVR Microcontroller with 32 KB In-System Programmable Flash; Flash Memory: 32 KB; EEPROM Memory: 1 KB; SRAM Memory: 2 KB; Timer 8 bits: 2; Timer 16 bits: 1; PWM Channel: 6; I/O Pins: 23; Supply Voltage (Vdd): 1.8 - 5.5 V; Clock Frequency: 0 - 20 MHz; Debug: debugWire; ADC Channel: 6; Serial USART: 1; Serial SPI: 1; Serial I2C: 1; Analog Comparator: 1
footprint DIP28-300(100) (DIP, 28-Leads, Row Spacing 7.62mm, Pitch 2.54mm, Body 34.67x7.3mm)
pins: 1 PC6/PCINT14/~{RESET} (io), 2 RXD/PCINT16/PD0 (io), 3 TXD/PCINT17/PD1 (io), 4 INT0/PCINT18/PD2 (io), 5 OC2B/INT1/PCINT19/PD3 (io), 6 XCK/T0/PCINT20/PD4 (io), 7 Vcc, 8 GND, 9 PB6/PCINT6/TOSC1/XTAL1 (io), 10 PB7/PCINT7/TOSC2/XTAL2 (io), 11 OC0B/T1/PCINT21/PD5 (io), 12 OC0A/AIN0/PCINT22/PD6 (io), 13 AIN1/PCINT23/PD7 (io), 14 PB0/PCINT0/CLKO/ICP1 (io), 15 PB1/PCINT1/OC1A (io), 16 PB2/PCINT2/OC1B/~{SS} (io), 17 PB3/PCINT3/OC2A/MOSI (io), 18 PB4/PCINT4/MISO (io), 19 PB5/PCINT5/SCK (io), 20 AVcc, 21 AREF, 22 GND, 23 PC0/PCINT8/ADC0 (io), 24 PC1/PCINT9/ADC1 (io), 25 PC2/PCINT10/ADC2 (io), 26 PC3/PCINT11/ADC3 (io), 27 PC4/PCINT12/ADC4/SDA (io), 28 PC5/PCINT13/ADC5/SCL (io)